# Altium footprint library SMT.PcbLib: 325 footprints (part 13 of 21)
Each footprint in its own frame and in the unit in brackets; x right, y up, seen from the top. Pads: shape width x height; smd on the part's side, far side on the other; paste and mask are expansions set on the pad; w line width, h text height; cw(c..) or ccw(c..) is an arc to the next point about the centre after c.
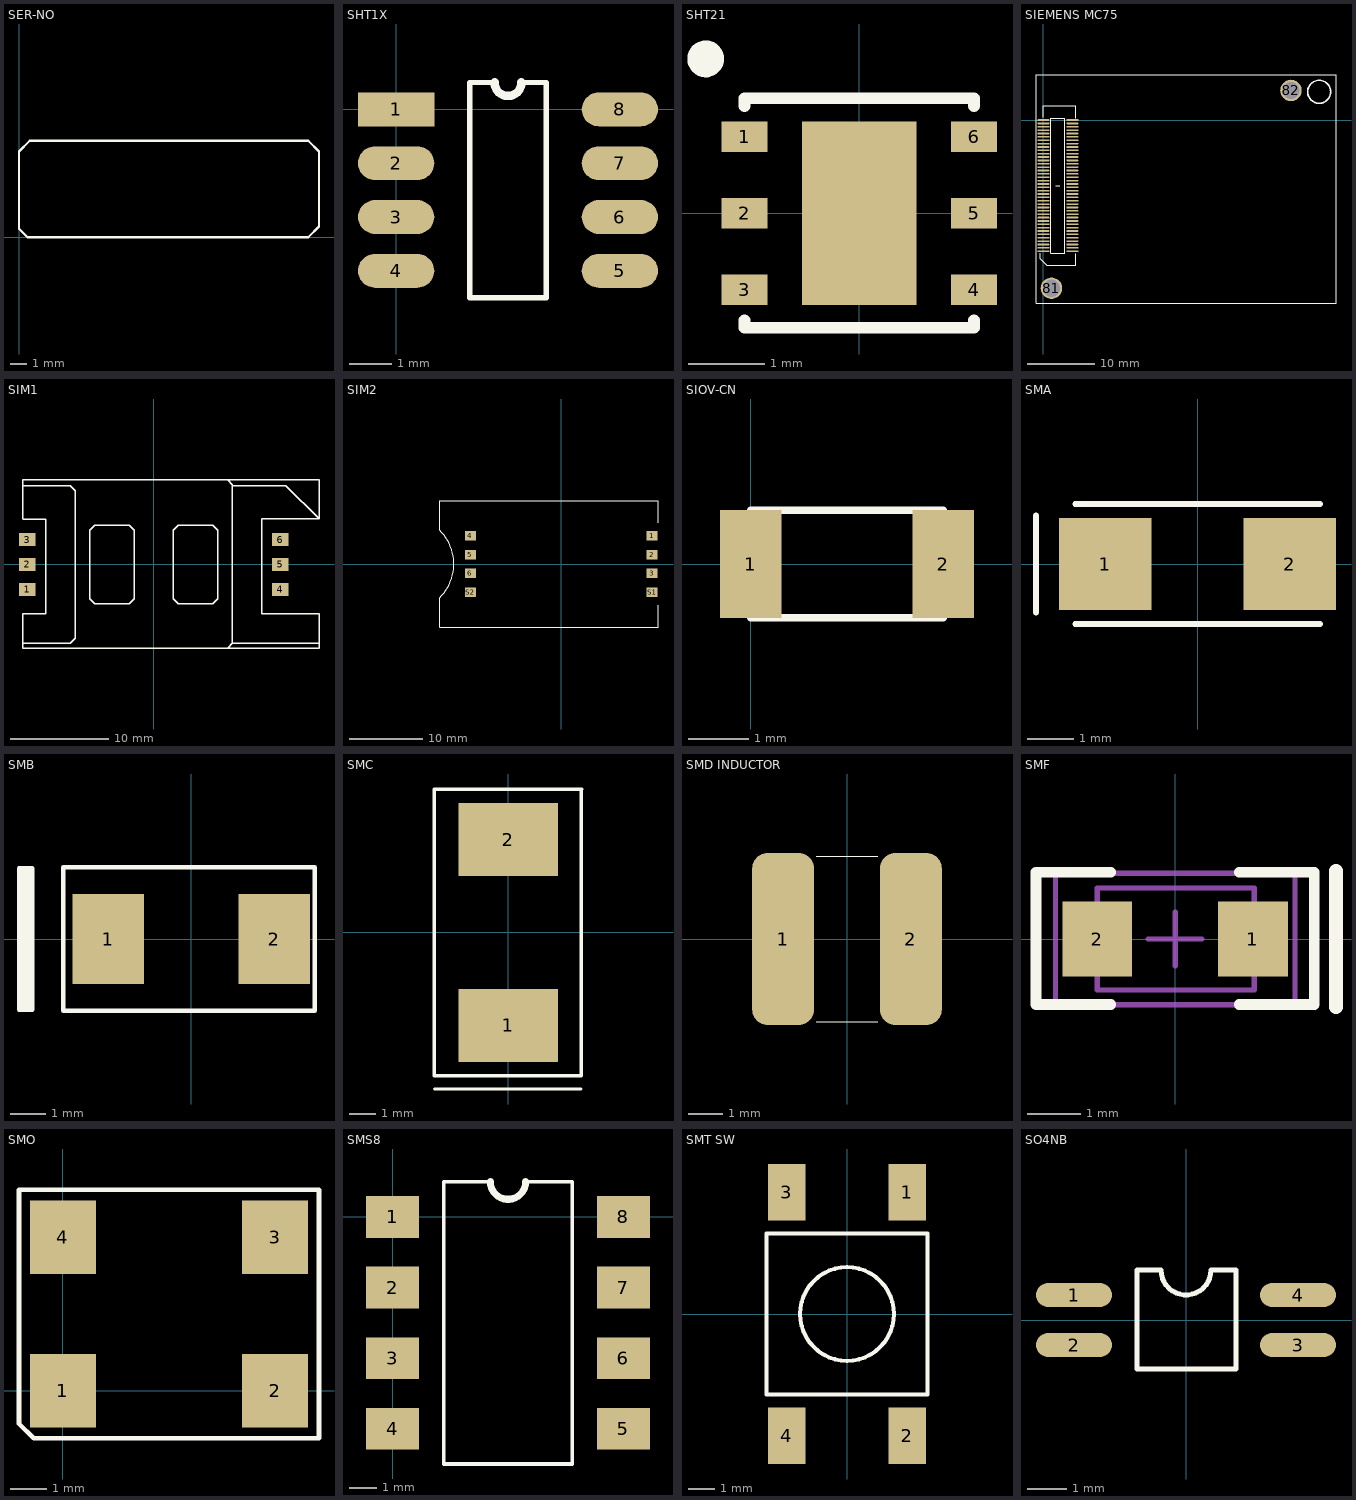
[diagram p12: the footprints below, top view; thin cyan lines are the x and y axes]

## SER-NO [mm]
TopOverlay:
  lines w0.127: 0,0.508 0,5.08 0.635,5.715 17.145,5.715 17.78,5.08 17.78,0.635 17.145,0 0.508,0 0,0.508

## SHT1X [mm]
pads (8):
  rect 1.8x0.8 smd: 1(0,0)
  oval 1.8x0.8 smd: 2(0,-1.27) 3(0,-2.54) 4(0,-3.81) 5(5.28,-3.81) 6(5.28,-2.54) 7(5.28,-1.27) 8(5.28,0)
TopOverlay:
  lines w0.127: 2.322,0.635 1.735,0.635 1.735,-4.445 3.545,-4.445 3.545,0.635 2.957,0.635
  lines w0.2: 2.322,0.635 ccw(c2.64,0.635) 2.957,0.635

## SHT21 [mm] "Humidity and Temperature Sensor"
height 1.1
pads (7):
  rect 0.6x0.4 smd: 1(-1.5,1) 2(-1.5,0) 3(-1.5,-1) 4(1.5,-1) 5(1.5,0) 6(1.5,1)
  rect 1.5x2.4 smd: ""(0,0)
TopOverlay:
  circle w0.254: c-2.008,2.016 r0.114
  lines w0.152: -1.5,-1.4 -1.5,-1.5 1.5,-1.5 1.5,-1.4 ; -1.5,1.4 -1.5,1.5 1.5,1.5 1.5,1.4

## SIEMENS MC75 [mm]
pads (82):
  rect 1.8x0.25 smd: 1(4.3,0)
  oval 1.8x0.25 smd: 2(4.3,-0.5) 3(4.3,-1) 4(4.3,-1.5) 5(4.3,-2) 6(4.3,-2.5) 7(4.3,-3) 8(4.3,-3.5) 9(4.3,-4) 10(4.3,-4.5) 11(4.3,-5) 12(4.3,-5.5) 13(4.3,-6) 14(4.3,-6.5) 15(4.3,-7) 16(4.3,-7.5) 17(4.3,-8) 18(4.3,-8.5) 19(4.3,-9) 20(4.3,-9.5) 21(4.3,-10) 22(4.3,-10.5) 23(4.3,-11) 24(4.3,-11.5) 25(4.3,-12) 26(4.3,-12.5) 27(4.3,-13) 28(4.3,-13.5) 29(4.3,-14) 30(4.3,-14.5) 31(4.3,-15) 32(4.3,-15.5) 33(4.3,-16) 34(4.3,-16.5) 35(4.3,-17) 36(4.3,-17.5) 37(4.3,-18) 38(4.3,-18.5) 39(4.3,-19) 40(4.3,-19.5) 41(0,-19.5) 42(0,-19) 43(0,-18.5) 44(0,-18) 45(0,-17.5) 46(0,-17) 47(0,-16.5) 48(0,-16) 49(0,-15.5) 50(0,-15) 51(0,-14.5) 52(0,-14) 53(0,-13.5) 54(0,-13) 55(0,-12.5) 56(0,-12) 57(0,-11.5) 58(0,-11) 59(0,-10.5) 60(0,-10) 61(0,-9.5) 62(0,-9) 63(0,-8.5) 64(0,-8) 65(0,-7.5) 66(0,-7) 67(0,-6.5) 68(0,-6) 69(0,-5.5) 70(0,-5) 71(0,-4.5) 72(0,-4) 73(0,-3.5) 74(0,-3) 75(0,-2.5) 76(0,-2) 77(0,-1.5) 78(0,-1) 79(0,-0.5) 80(0,0)
  round 3.2 hole 2.54: 81(1.2,-25) 82(36.8,4.4)
TopOverlay:
  circle w0.254: c41,4.2 r1.712
  lines w0.127: -0.5,-19.8 -0.5,-20.6 0.5,-21.6 4.8,-21.6 4.8,-19.9 ; 0,0.4 0,2.1 0.5,2.1 4.8,2.1 4.8,0.3 ; 1.815,-9.735 2.445,-9.735 ; 1.1,-19.8 1.1,0.3 3.2,0.3 3.2,-19.8 ; 1.1,-19.8 3.2,-19.8 ; 1.1,-19.8 3.2,-19.8 ; -1.1,-27.2 -1.1,6.7 43.5,6.7 43.5,-27.2 -1.1,-27.2

## SIM1 [mm] "P/N C707 10M006 0002"
height 2.6
pads (6):
  rect 1.7x1.3 smd: 1(-12.85,-2.54) 2(-12.85,0) 3(-12.85,2.54) 4(12.85,-2.54) 5(12.85,0) 6(12.85,2.54)
TopOverlay:
  lines w0.152: -13.3,-8 -8.5,-8 -8,-7.5 -8,7.5 -8.5,8 -13.3,8 ; -13.3,4.6 -11,4.6 -11,-5 -13.3,-5 -13.3,-8.5 0,-8.5 16.8,-8.5 16.8,-5 11,-5 11,4.64 16.8,4.64 ; -13.3,4.64 -13.3,8.6 0,8.6 16.8,8.6 16.8,4.64 ; 7.5,-8.5 8,-8 ; 7.5,8.6 8,8.1 8,8 ; 16.8,-8 8,-8 ; 8,-8 8,-8 ; 8,-8 8,8 ; 8,8 13.44,8 16.8,4.64 ; -6.5,-3.5 -6.5,3.5 -6,4 -2.5,4 -2,3.5 -2,-3.5 -2.5,-4 -6,-4 -6.5,-3.5 ; 2,-3.5 2,3.5 2.5,4 6,4 6.5,3.5 6.5,-3.5 6,-4 2.5,-4 2,-3.5
3D body: height 1.6, standoff 0, extent -13.31,-8.509 16.789,8.611
3D body: height 2.6, standoff 0, extent 7.518,-8.484 16.815,-8.001
3D body: height 2.6, standoff 0, extent 7.493,4.648 16.789,8.611
3D body: height 2.6, standoff 0, extent -13.31,-8.509 8.001,8.611

## SIM2 [mm] "CCM03-3013LFT R102"
height 1.25
pads (8):
  rect 1.5x1.3 smd: 1(12.35,3.81) 2(12.35,1.27) 3(12.35,-1.27) 4(-12.35,3.81) 5(-12.35,1.27) 6(-12.35,-1.27) S1(12.35,-3.81) S2(-12.35,-3.81)
TopOverlay:
  lines w0.127: 13.15,-5.6 13.15,-8.6 0,-8.6 -16.5,-8.6 -16.5,-4.6 ccw(c-21.1,0) -16.5,4.6 -16.5,8.6 0,8.6 13.15,8.6 13.15,5.6

## SIOV-CN [mil]
pads (2):
  rect 40x70 smd: 1(0,0) 2(125,0)
TopOverlay:
  lines w5: 0,-35 125,-35 ; 0,35 125,35

## SMA [mm] "CASE 403D-02"
height 2.1
pads (2):
  rect 2x2 smd: 1(-2,0) 2(2,0)
TopOverlay:
  lines w0.127: -3.5,-1.05 -3.5,1.05 ; -2.65,-1.3 0,-1.3 2.65,-1.3 ; -2.65,1.3 0,1.3 2.65,1.3

## SMB [mil]
pads (2):
  rect 80x100 smd: 1(-92.5,0) 2(92.5,0)
TopOverlay:
  rectangle: -191.93,-78.74 -177.17,78.74
  lines w5: -191.93,-78.74 -191.93,78.74 -177.17,78.74 -177.17,-78.74 -191.93,-78.74 ; -142.5,-80 -142.5,80 137.5,80 137.5,-80 -142.5,-80

## SMC [mm]
pads (2):
  rect 3.8x2.8 smd: 1(0,-3.55) 2(0,3.55)
TopOverlay:
  lines w0.127: -2.813,-5.468 -2.813,5.48 ; -2.81,-5.979 2.79,-5.979 ; -2.81,-5.471 2.788,-5.468 ; -2.79,5.471 2.81,5.471 ; 2.794,5.467 2.8,-5.474
3D body: height 2.45, standoff 0, extent -2.813,-5.471 2.788,5.48
3D body: height 2.46, standoff 2.45, extent -2.797,-4.875 2.804,-4.249

## SMD INDUCTOR [mm] "SURFACEMOUNT INDUCTOR MCSDC0503-221KU"
height 3
pads (2):
  rrect50% 1.8x5 smd: 1(-1.85,0) 2(1.85,0)
TopOverlay:
  lines w0.025: -0.889,-2.4 0.889,-2.4 ; -0.889,2.4 0.889,2.4

## SMF [mm] "Chip Diode 2-Leads"
height 1.08
pads (2):
  rect 1.3x1.4 smd: 1(1.45,0) 2(-1.45,0)
TopOverlay:
  lines w0.2: -1.195,-1.219 -2.589,-1.219 -2.589,1.245 -1.195,1.245 ; 1.195,-1.219 2.589,-1.219 2.589,1.245 1.195,1.245
  lines w0.254: 2.995,-1.27 2.995,1.27
Mechanical13:
  lines w0.1: 1.45,0.95 -1.45,0.95 -1.45,-0.95 1.471,-0.95 1.471,0.95
Mechanical15:
  lines w0.1: -0.5,0 0.5,0 ; 0,-0.5 0,0.5 ; -2.225,-1.225 2.233,-1.225 2.233,1.225 -2.225,1.225 -2.225,-1.225
3D body: height 1.08, standoff 0, extent -1.45,-0.94 1.471,0.991

## SMO [mm]
pads (4):
  rect 1.8x2 smd: 1(0,0) 2(5.8,0) 3(5.8,4.2) 4(0,4.2)
TopOverlay:
  lines w0.127: -1.2,-0.9 -1.2,5.5 7,5.5 7,-1.3 -0.8,-1.3 -1.2,-0.9

## SMS8 [mil]
pads (8):
  rect 75x59 smd: 1(0,0) 2(0,-100) 3(0,-200) 4(0,-300) 5(327,-300) 6(327,-200) 7(327,-100) 8(327,0)
TopOverlay:
  lines w5: 138.5,50 72.5,50 72.5,-350 254.5,-350 254.5,50 188.5,50
  lines w10: 138.5,50 ccw(c163.5,50) 188.5,50

## SMT SW [mm] "C-2-1437565-7"
height 4
pads (4):
  rect 1.4x2.1 smd: 1(2.25,4.55) 2(2.25,-4.55) 3(-2.25,4.55) 4(-2.25,-4.55)
TopOverlay:
  circle w0.152: c0,0 r1.75
  lines w0.152: -3,-3 -3,0 -3,3 3,3 3,0 3,-3 -3,-3

## SO4NB [mil]
pads (4):
  oval 76x24 smd: 1(-112,25) 2(-112,-25) 3(112,-25) 4(112,25)
TopOverlay:
  lines w5: -49.21,-49.21 -49.21,50 -25,50 ccw(c0,50) 25,50 50,50 50,-49.21 -49.21,-49.21
3D body: height 32.48, standoff 22.64, extent -84.44,-32.28 -52.94,-17.52
3D body: height 32.48, standoff 0, extent -92.31,-32.28 -84.44,-17.52
3D body: height 9.84, standoff 0, extent -127.75,-32.28 -92.31,-17.52
3D body: height 9.84, standoff 0, extent -127.75,17.72 -92.31,32.48
3D body: height 32.48, standoff 0, extent -92.31,17.72 -84.44,32.48
3D body: height 32.48, standoff 22.64, extent -84.44,17.72 -52.94,32.48
3D body: height 32.48, standoff 22.64, extent 52.94,17.52 84.44,32.29
3D body: height 32.48, standoff 0, extent 84.44,17.52 92.31,32.29
3D body: height 9.84, standoff 0, extent 92.31,17.52 127.75,32.29
3D body: height 32.48, standoff 22.64, extent 52.94,-32.48 84.44,-17.71
3D body: height 32.48, standoff 0, extent 84.44,-32.48 92.31,-17.71
3D body: height 9.84, standoff 0, extent 92.31,-32.48 127.75,-17.71
3D body: height 68.9, standoff 0, extent -49.21,-49.21 54.13,49.22